# Altium footprint library 3.22-杂项.PcbLib: 985 footprints (part 24 of 64)
Each footprint in its own frame and in the unit in brackets; x right, y up, seen from the top. Pads: shape width x height; smd on the part's side, far side on the other; paste and mask are expansions set on the pad; w line width, h text height; cw(c..) or ccw(c..) is an arc to the next point about the centre after c.
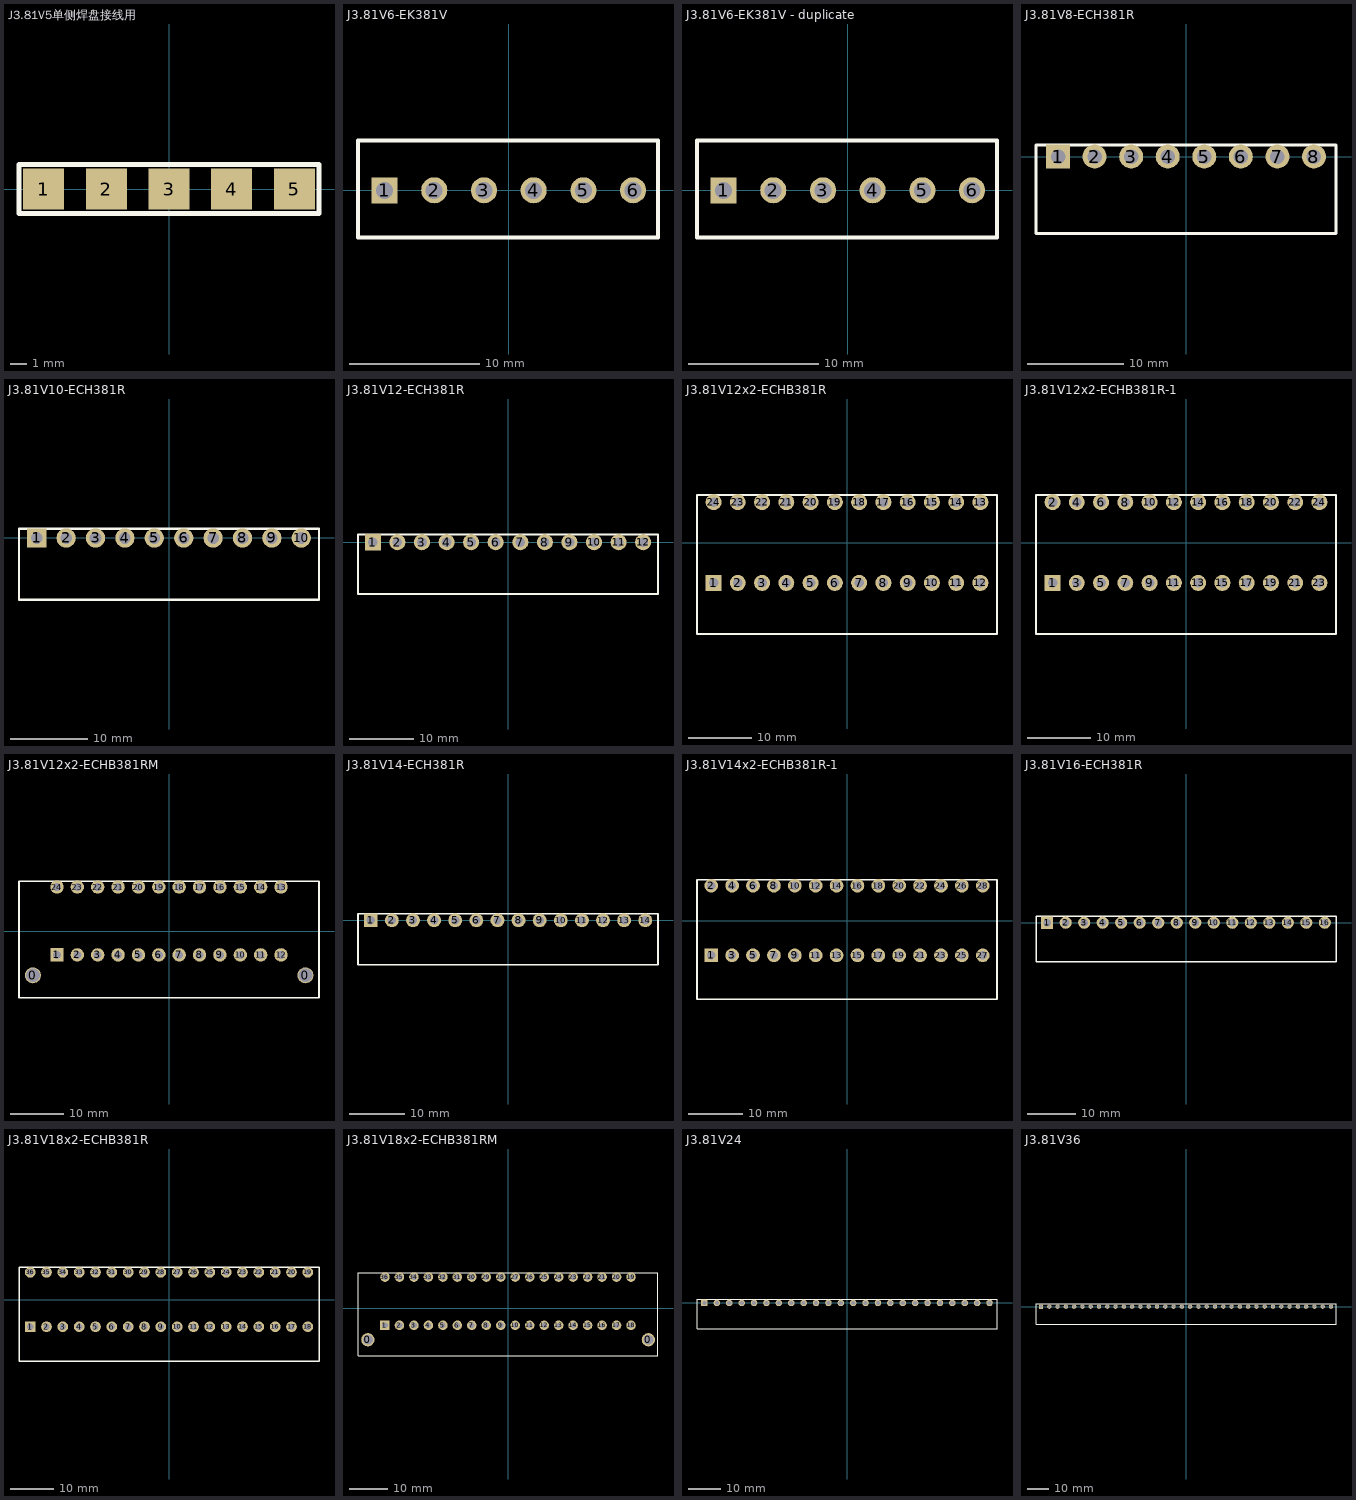
[diagram p23: the footprints below, top view; thin cyan lines are the x and y axes]

## J3.81V5单侧焊盘接线用 [mm] "1排，3.81间距，5芯，不用座，只手将线焊在板上临时用"
height 8.5
pads (5):
  rect 2.5x2.5 smd: 1(-7.62,0) 2(-3.81,0) 3(0,0) 4(3.81,0) 5(7.62,0)
Top Overlay:
  lines w0.305: -9.12,-1.5 9.12,-1.5 9.12,1.5 -9.12,1.5 -9.12,-1.5

## J3.81V6-EK381V [mm] "1排，3.81间距，6芯，不可插拔，EK381V"
height 8.5
pads (6):
  rect 2x2 hole 1.3: 1(-9.525,0)
  round 2 hole 1.3: 2(-5.715,0) 3(-1.905,0) 4(1.905,0) 5(5.715,0) 6(9.525,0)
Top Overlay:
  lines w0.305: -11.557,-3.6 -11.557,3.8 ; -11.435,-3.6 11.435,-3.6 11.435,3.8 -11.435,3.8

## J3.81V6-EK381V - duplicate [mm] "1排，3.81间距，6芯，不可插拔，EK381V"
height 8.5
pads (6):
  rect 2x2 hole 1.3: 1(-9.525,0)
  round 2 hole 1.3: 2(-5.715,0) 3(-1.905,0) 4(1.905,0) 5(5.715,0) 6(9.525,0)
Top Overlay:
  lines w0.305: -11.557,-3.6 -11.557,3.8 ; -11.435,-3.6 11.435,-3.6 11.435,3.8 -11.435,3.8

## J3.81V8-ECH381R [mm] "1排，3.81间距，8芯，不带镙丝可插拔，ECH381R"
height 7
pads (8):
  rect 2.5x2.5 hole 1.5: 1(-13.335,0)
  round 2.5 hole 1.5: 2(-9.525,0) 3(-5.715,0) 4(-1.905,0) 5(1.905,0) 6(5.715,0) 7(9.525,0) 8(13.335,0)
Top Overlay:
  lines w0.305: -15.635,-8 15.635,-8 15.635,1.2 -15.635,1.2 -15.635,-8

## J3.81V10-ECH381R [mm] "1排，3.81间距，10芯，不带镙丝可插拔，ECH381R"
height 7
pads (10):
  rect 2.5x2.5 hole 1.5: 1(-17.145,0)
  round 2.5 hole 1.5: 2(-13.335,0) 3(-9.525,0) 4(-5.715,0) 5(-1.905,0) 6(1.905,0) 7(5.715,0) 8(9.525,0) 9(13.335,0) 10(17.145,0)
Top Overlay:
  lines w0.305: -19.445,-8 -19.445,1.2 19.445,1.2 19.445,-8 -19.445,-8

## J3.81V12-ECH381R [mm] "1排，3.81间距，12芯，不带镙丝可插拔，ECH381R"
height 7
pads (12):
  rect 2.5x2.5 hole 1.5: 1(-20.955,0)
  round 2.5 hole 1.5: 2(-17.145,0) 3(-13.335,0) 4(-9.525,0) 5(-5.715,0) 6(-1.905,0) 7(1.905,0) 8(5.715,0) 9(9.525,0) 10(13.335,0) 11(17.145,0) 12(20.955,0)
Top Overlay:
  lines w0.305: -23.255,-8 -23.255,1.2 23.255,1.2 23.255,-8 -23.255,-8

## J3.81V12x2-ECHB381R [mm] "前后两排，3.81间距，每排12芯，不带镙丝可插拔，ECHB381R"
height 22.7
pads (24):
  rect 2.5x2.5 hole 1.5: 1(-20.955,-6.35)
  round 2.5 hole 1.5: 2(-17.145,-6.35) 3(-13.335,-6.35) 4(-9.525,-6.35) 5(-5.715,-6.35) 6(-1.905,-6.35) 7(1.905,-6.35) 8(5.715,-6.35) 9(9.525,-6.35) 10(13.335,-6.35) 11(17.145,-6.35) 12(20.955,-6.35) 13(20.955,6.35) 14(17.145,6.35) 15(13.335,6.35) 16(9.525,6.35) 17(5.715,6.35) 18(1.905,6.35) 19(-1.905,6.35) 20(-5.715,6.35) 21(-9.525,6.35) 22(-13.335,6.35) 23(-17.145,6.35) 24(-20.955,6.35)
Top Overlay:
  lines w0.305: -23.555,-14.35 23.555,-14.35 23.555,7.45 -23.555,7.45 -23.555,-14.35

## J3.81V12x2-ECHB381R-1 [mm] "前后两排，3.81间距，每排12芯，不带镙丝可插拔，ECHB381R"
height 22.7
pads (24):
  rect 2.5x2.5 hole 1.5: 1(-20.955,-6.35)
  round 2.5 hole 1.5: 2(-20.955,6.35) 3(-17.145,-6.35) 4(-17.145,6.35) 5(-13.335,-6.35) 6(-13.335,6.35) 7(-9.525,-6.35) 8(-9.525,6.35) 9(-5.715,-6.35) 10(-5.715,6.35) 11(-1.905,-6.35) 12(-1.905,6.35) 13(1.905,-6.35) 14(1.905,6.35) 15(5.715,-6.35) 16(5.715,6.35) 17(9.525,-6.35) 18(9.525,6.35) 19(13.335,-6.35) 20(13.335,6.35) 21(17.145,-6.35) 22(17.145,6.35) 23(20.955,-6.35) 24(20.955,6.35)
Top Overlay:
  lines w0.305: -23.555,-14.35 23.555,-14.35 23.555,7.45 -23.555,7.45 -23.555,-14.35

## J3.81V12x2-ECHB381RM [mm] "前后两排，3.81间距，每排12芯，带镙丝可插拔，ECHB381RM。"
height 22.7
pads (26):
  round 3 hole 2.6: 0(-25.491,-8.255) 0(25.491,-8.255)
  rect 2.5x2.5 hole 1.5: 1(-20.991,-4.445)
  round 2.5 hole 1.5: 2(-17.181,-4.445) 3(-13.371,-4.445) 4(-9.561,-4.445) 5(-5.751,-4.445) 6(-1.941,-4.445) 7(1.869,-4.445) 8(5.679,-4.445) 9(9.489,-4.445) 10(13.299,-4.445) 11(17.109,-4.445) 12(20.919,-4.445) 13(20.919,8.255) 14(17.109,8.255) 15(13.299,8.255) 16(9.489,8.255) 17(5.679,8.255) 18(1.869,8.255) 19(-1.941,8.255) 20(-5.751,8.255) 21(-9.561,8.255) 22(-13.371,8.255) 23(-17.181,8.255) 24(-20.991,8.255)
Top Overlay:
  lines w0.305: -28.091,-12.445 28.019,-12.445 28.019,9.355 -28.091,9.355 -28.091,-12.445

## J3.81V14-ECH381R [mm] "1排，3.81间距，14芯，不带镙丝可插拔，ECH381R"
height 7
pads (14):
  rect 2.5x2.5 hole 1.5: 1(-24.765,0)
  round 2.5 hole 1.5: 2(-20.955,0) 3(-17.145,0) 4(-13.335,0) 5(-9.525,0) 6(-5.715,0) 7(-1.905,0) 8(1.905,0) 9(5.715,0) 10(9.525,0) 11(13.335,0) 12(17.145,0) 13(20.955,0) 14(24.765,0)
Top Overlay:
  lines w0.305: -27.065,-8 -27.065,1.2 27.065,1.2 27.065,-8 -27.065,-8

## J3.81V14x2-ECHB381R-1 [mm] "前后两排，3.81间距，每排14芯，不带镙丝可插拔，ECHB381R"
height 22.7
pads (28):
  rect 2.5x2.5 hole 1.5: 1(-24.765,-6.35)
  round 2.5 hole 1.5: 2(-24.765,6.35) 3(-20.955,-6.35) 4(-20.955,6.35) 5(-17.145,-6.35) 6(-17.145,6.35) 7(-13.335,-6.35) 8(-13.335,6.35) 9(-9.525,-6.35) 10(-9.525,6.35) 11(-5.715,-6.35) 12(-5.715,6.35) 13(-1.905,-6.35) 14(-1.905,6.35) 15(1.905,-6.35) 16(1.905,6.35) 17(5.715,-6.35) 18(5.715,6.35) 19(9.525,-6.35) 20(9.525,6.35) 21(13.335,-6.35) 22(13.335,6.35) 23(17.145,-6.35) 24(17.145,6.35) 25(20.955,-6.35) 26(20.955,6.35) 27(24.765,-6.35) 28(24.765,6.35)
Top Overlay:
  lines w0.305: -27.365,-14.35 27.365,-14.35 27.365,7.45 -27.365,7.45 -27.365,-14.35

## J3.81V16-ECH381R [mm] "1排，3.81间距，16芯，不带镙丝可插拔，ECH381R"
height 7
pads (16):
  rect 2.5x2.5 hole 1.5: 1(-28.575,0)
  round 2.5 hole 1.5: 2(-24.765,0) 3(-20.955,0) 4(-17.145,0) 5(-13.335,0) 6(-9.525,0) 7(-5.715,0) 8(-1.905,0) 9(1.905,0) 10(5.715,0) 11(9.525,0) 12(13.335,0) 13(17.145,0) 14(20.955,0) 15(24.765,0) 16(28.575,0)
Top Overlay:
  lines w0.305: -30.875,-8 30.875,-8 30.875,1.3 -30.875,1.3 -30.875,-8

## J3.81V18x2-ECHB381R [mm] "前后两排，3.81间距，每排18芯，不带镙丝可插拔，ECHB381R"
height 22.7
pads (36):
  rect 2.5x2.5 hole 1.5: 1(-32.385,-6.35)
  round 2.5 hole 1.5: 2(-28.575,-6.35) 3(-24.765,-6.35) 4(-20.955,-6.35) 5(-17.145,-6.35) 6(-13.335,-6.35) 7(-9.525,-6.35) 8(-5.715,-6.35) 9(-1.905,-6.35) 10(1.905,-6.35) 11(5.715,-6.35) 12(9.525,-6.35) 14(17.145,-6.35) 15(20.955,-6.35) 17(28.575,-6.35) 18(32.385,-6.35) 20(28.575,6.35) 21(24.765,6.35) 22(20.955,6.35) 23(17.145,6.35) 24(13.335,6.35) 25(9.525,6.35) 26(5.715,6.35) 27(1.905,6.35) 28(-1.905,6.35) 29(-5.715,6.35) 30(-9.525,6.35) 31(-13.335,6.35) 32(-17.145,6.35) 33(-20.955,6.35) 34(-24.765,6.35) 35(-28.575,6.35) 36(-32.385,6.35)
  round 2.5 hole 1.3: 13(13.335,-6.35) 16(24.765,-6.35) 19(32.385,6.35)
Top Overlay:
  lines w0.305: -34.985,-14.35 -34.985,7.55 34.985,7.55 34.985,-14.35 -34.985,-14.35

## J3.81V18x2-ECHB381RM [mm] "前后两排，3.81间距，每排18芯，带镙丝可插拔，ECHB381RM。"
height 22.7
pads (38):
  round 3.5 hole 2.6: 0(-36.921,-8.255) 0(36.921,-8.255)
  rect 2.5x2.5 hole 1.5: 1(-32.421,-4.445)
  round 2.5 hole 1.5: 2(-28.611,-4.445) 3(-24.801,-4.445) 4(-20.991,-4.445) 5(-17.181,-4.445) 6(-13.371,-4.445) 7(-9.561,-4.445) 8(-5.751,-4.445) 9(-1.941,-4.445) 10(1.869,-4.445) 11(5.679,-4.445) 12(9.489,-4.445) 14(17.109,-4.445) 15(20.919,-4.445) 17(28.539,-4.445) 18(32.349,-4.445) 20(28.539,8.255) 21(24.729,8.255) 22(20.919,8.255) 23(17.109,8.255) 24(13.299,8.255) 25(9.489,8.255) 26(5.679,8.255) 27(1.869,8.255) 28(-1.941,8.255) 29(-5.751,8.255) 30(-9.561,8.255) 31(-13.371,8.255) 32(-17.181,8.255) 33(-20.991,8.255) 34(-24.801,8.255) 35(-28.611,8.255) 36(-32.421,8.255)
  round 2.5 hole 1.3: 13(13.299,-4.445) 16(24.729,-4.445) 19(32.349,8.255)
Top Overlay:
  lines w0.305: -39.521,-12.445 39.449,-12.445 39.449,9.355 -39.521,9.355 -39.521,-12.445

## J3.81V24 [mm] "1排，3.81间距，24芯，可插拔"
height 26.1
pads (24):
  rect 2x2 hole 1.3: 1(-43.815,0)
  round 2 hole 1.3: 2(-40.005,0) 3(-36.195,0) 4(-32.385,0) 5(-28.575,0) 6(-24.765,0) 7(-20.955,0) 8(-17.145,0) 9(-13.335,0) 10(-9.525,0) 11(-5.715,0) 12(-1.905,0) 13(1.905,0) 14(5.715,0) 15(9.525,0) 16(13.335,0) 17(17.145,0) 18(20.955,0) 19(24.765,0) 20(28.575,0) 21(32.385,0) 22(36.195,0) 23(40.005,0) 24(43.815,0)
Top Overlay:
  lines w0.305: -46.115,-8 -46.115,1.2 46.115,1.2 46.115,-8 -46.115,-8

## J3.81V36 [mm] "1排，3.81间距，36芯，可插拔"
height 26.1
pads (36):
  rect 2x2 hole 1.3: 1(-66.675,0)
  round 2 hole 1.3: 2(-62.865,0) 3(-59.055,0) 4(-55.245,0) 5(-51.435,0) 6(-47.625,0) 7(-43.815,0) 8(-40.005,0) 9(-36.195,0) 10(-32.385,0) 11(-28.575,0) 12(-24.765,0) 13(-20.955,0) 14(-17.145,0) 15(-13.335,0) 16(-9.525,0) 17(-5.715,0) 18(-1.905,0) 19(1.905,0) 20(5.715,0) 21(9.525,0) 22(13.335,0) 23(17.145,0) 24(20.955,0) 25(24.765,0) 26(28.575,0) 27(32.385,0) 28(36.195,0) 29(40.005,0) 30(43.815,0) 31(47.625,0) 32(51.435,0) 33(55.245,0) 34(59.055,0) 35(62.865,0) 36(66.675,0)
Top Overlay:
  lines w0.305: -68.975,-8 -68.975,1.2 68.975,1.2 68.975,-8 -68.975,-8